# Altium integrated library Altium Library_EE4951.IntLib: 287 symbols (part 1 of 2)
Pins are listed as number, name and electrical type; pins without a type are passive.

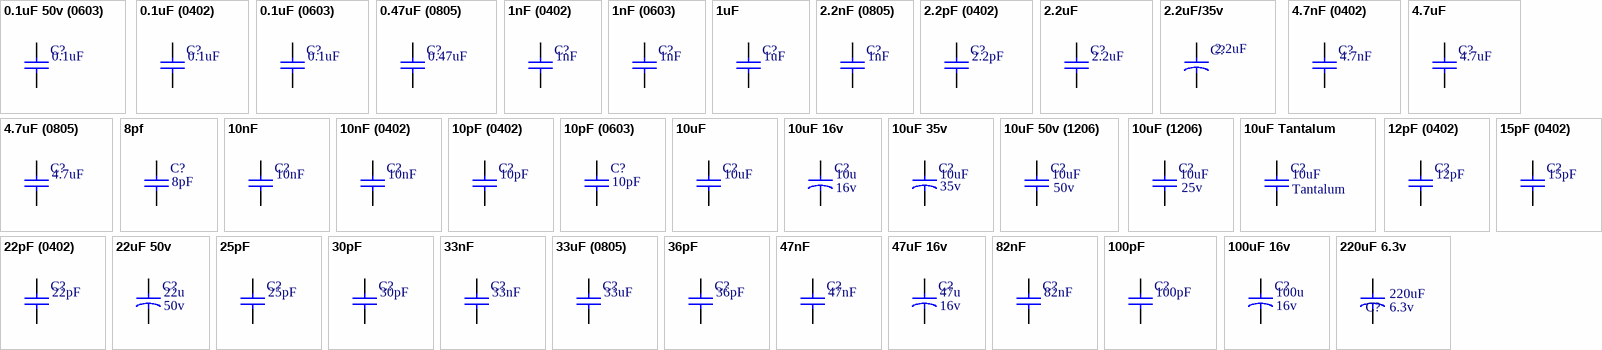
[diagram p0: symbols 0.1uF 50v (0603) to 220uF 6.3v]

## 0.1uF 50v (0603)
designator C?, comment 0.1uF
MFG_PN: VJ0603V104ZXAPW1BC; MFG: Vishay; Voltage: 50v; LOAD: NL; Value: 0.1uF
footprint CAP0603W (capacitor 0603 wave soldering)
footprint CAP0603R (capacitor 0603 reflow soldering)
pins: 1, 2

## 0.1uF (0402)
designator C?, comment 0.1uF
Tolerance: 20%; MFG_PN: VJ0402G104MXQCW1BC; MFG: Vishay; Voltage: 10v; LOAD: NL; Value: 0.1uF
footprint CAP0402R (Capacitor 0402 reflow soldering)
pins: 1, 2

## 0.1uF (0603)
designator C?, comment 0.1uF
MFG_PN: VJ0603Y104JXJPW1BC; MFG: Vishay; LOAD: NL; Value: 0.1uF
footprint CAP0603W (capacitor 0603 wave soldering)
footprint CAP0603R (capacitor 0603 reflow soldering)
pins: 1, 2

## 0.47uF (0805)
designator C?, comment 0.47uF
MFG_PN: VJ0805V474MXXCW1BC; MFG: Vishay; Voltage: 25v; LOAD: NL; Value: 0.47uF
footprint CAP0805R (capacitor 0805 reflow soldering)
footprint CAP0805W (capacitor 0805 wave soldering)
pins: 1, 2

## 1nF (0402)
designator C?, comment 1nF
Tolerance: 10%; MFG_PN: VJ0402Y102KXAAC; MFG: Vishay; Voltage: 50v; LOAD: NL; Value: 1nF
footprint CAP0402R (Capacitor 0402 reflow soldering)
pins: 1, 2

## 1nF (0603)
designator C?, comment 1nF
MFG_PN: VJ0603Y102KXBAC31; MFG: Vishay; LOAD: NL; Value: 1nF
footprint CAP0603W (capacitor 0603 wave soldering)
footprint CAP0603R (capacitor 0603 reflow soldering)
pins: 1, 2

## 1uF
designator C?
MFG_PN: VJ0805V105ZXXTW1BC; MFG: Vishay; Voltage: 25v; LOAD: NL; Value: 1uF
footprint CAP0603W (capacitor 0603 wave soldering)
footprint CAP0603R (capacitor 0603 reflow soldering)
pins: 1, 2

## 2.2nF (0805)
designator C?, comment 1nF
Tolerance: 10%; MFG_PN: VJ0805A222KXXPW1BC; MFG: Vishay; Voltage: 25v; LOAD: NL; Value: 1nF
footprint CAP0805R (capacitor 0805 reflow soldering)
footprint CAP0805W (capacitor 0805 wave soldering)
pins: 1, 2

## 2.2pF (0402)
designator C?, comment 2.2pF
Tolerance: 10%; MFG_PN: VJ0402A2R2DXXCW1BC; MFG: Vishay; Voltage: 25v; LOAD: NL; Value: 2.2pF
footprint CAP0402R (Capacitor 0402 reflow soldering)
pins: 1, 2

## 2.2uF
designator C?
MFG1_PN: VJ1206V225ZXXRW1BC; MFG1: Vishay; Value: 2.2uF
footprint CAP1206W (capacitor 1206 wave soldering)
pins: 1, 2

## 2.2uF/35v
designator C?, comment 2.2uF
Tolerance: 20%; MFG1_PN: EEE-FC1V2R2AR; MFG1: PANASONIC; Voltage: 35v; Value: 2.2uF
footprint SMD Elec Cap (5.5_5.4_4) (L=5.5mm, H=5.4mm, D=4mm)
pins: 1, 2

## 4.7nF (0402)
designator C?, comment 4.7nF
Tolerance: 10%; MFG_PN: VJ0402Y472KXACW1BC; MFG: Vishay; Voltage: 50v; LOAD: NL; Value: 4.7nF
footprint CAP0402R (Capacitor 0402 reflow soldering)
pins: 1, 2

## 4.7uF
designator C?
MFG1_PN: VJ1206V475ZXJTW1BC; MFG1: Vishay; Voltage: 16v; Value: 4.7uF
footprint CAP1206W (capacitor 1206 wave soldering)
pins: 1, 2

## 4.7uF (0805)
designator C?, comment 4.7uF
MFG_PN: VJ0805V475MXQTW1BC; MFG: Vishay; Voltage: 10v; LOAD: NL; Value: 4.7uF
footprint CAP0805R (capacitor 0805 reflow soldering)
footprint CAP0805W (capacitor 0805 wave soldering)
pins: 1, 2

## 8pf
designator C?, comment 8pF
MFG1_PN: 06031A8R0CAT2A; MFG1: AVX; Value: 8pF
footprint CAP0603W (capacitor 0603 wave soldering)
pins: 1, 2

## 10nF
designator C?
MFG1_PN: VJ0603Y103KXAAC; MFG1: Vishay; Value: 10nF
footprint CAP0603W (capacitor 0603 wave soldering)
footprint CAP0805R (capacitor 0805 reflow soldering)
pins: 1, 2

## 10nF (0402)
designator C?, comment 10nF
Tolerance: 5%; MFG_PN: VJ0402Y103JXXAC; MFG: Vishay; Voltage: 25v; LOAD: NL; Value: 10nF
footprint CAP0402R (Capacitor 0402 reflow soldering)
pins: 1, 2

## 10pF (0402)
designator C?, comment 10pF
Tolerance: 5%; MFG_PN: VJ0402A100JXACW1BC; MFG: Vishay; Voltage: 50v; LOAD: NL; Value: 10pF
footprint CAP0402R (Capacitor 0402 reflow soldering)
pins: 1, 2

## 10pF (0603)
designator C?, comment 10pF
Tolerance: 1%; MFG_PN: VJ0603A100FXACW1BC; MFG: VISHAY; Voltage: 50v; LOAD: NL; Value: 10pF
footprint CAP0603W (capacitor 0603 wave soldering)
footprint CAP0603R (capacitor 0603 reflow soldering)
pins: 1, 2

## 10uF
designator C?
MFG1_PN: VJ1206V106ZXQTW1BC; MFG1: Vishay; Value: 10uF
footprint CAP1206R (capacitor 1206 reflow soldering)
pins: 1, 2

## 10uF 16v
designator C?, comment Voltage: 16v  (hidden comment: 10u)
Tolerance: 20%; MFG_PN: EEE-FK1C100R; MFG: Panasonic; LOAD: NL; Value: 10u
footprint SMD Elec Cap (5.8_5.8_4) (L=5.8mm, H=5.8mm, D=4mm)
pins: 1, 2

## 10uF 35v
designator C?, comment Voltage: 35v  (hidden comment: 10uF)
MFG1_PN: EEE-HB1V100R; MFG1: Panasonic; Value: 10uF
footprint SMD Elec Cap (5.5_6.5_5) (L=5.5mm, H=6.5mm, D=5mm)
pins: 1, 2

## 10uF 50v (1206)
designator C?, comment Voltage: 50v  (hidden comment: 10uF)
Tolerance: 10%; MFG_PN: C3216X5R1H106K160AB; MFG: TDK; LOAD: NL; Value: 10uF
footprint CAP1206R (capacitor 1206 reflow soldering)
footprint CAP1206W (capacitor 1206 wave soldering)
pins: 1, 2

## 10uF (1206)
designator C?, comment Voltage: 25v  (hidden comment: 10uF)
Tolerance: 10%; MFG_PN: GRJ31CR71E106KE11L; MFG: MURATA; LOAD: NL; Value: 10uF
footprint CAP1206R (capacitor 1206 reflow soldering)
footprint CAP1206W (capacitor 1206 wave soldering)
pins: 1, 2

## 10uF Tantalum
designator C?, comment Type: Tantalum  (hidden comment: 10uF)
MFG1_PN: 293D106X96R3A2TE3; MFG1: Vishay; Value: 10uF
footprint CAP1206W (capacitor 1206 wave soldering)
pins: 1, 2

## 12pF (0402)
designator C?, comment 12pF
Tolerance: 5%; MFG_PN: GRM1555C1H120JA01D; MFG: Murata; Voltage: 50v; LOAD: NL; Value: 12pF
footprint CAP0402R (Capacitor 0402 reflow soldering)
pins: 1, 2

## 15pF (0402)
designator C?, comment 15pF
Tolerance: 5%; MFG_PN: VJ0402A150JXACW1BC; MFG: Vishay; Voltage: 50v; LOAD: NL; Value: 15pF
footprint CAP0402R (Capacitor 0402 reflow soldering)
pins: 1, 2

## 22pF (0402)
designator C?, comment 22pF
Tolerance: 5%; MFG_PN: 04025A220JAT2A; MFG: AVX; Voltage: 50v; LOAD: NL; Value: 22pF
footprint CAP0402R (Capacitor 0402 reflow soldering)
pins: 1, 2

## 22uF 50v
designator C?, comment Voltage: 50v  (hidden comment: 22u)
MFG1_PN: EEE-FK1H220P; MFG1: Panasonic; Value: 22u
footprint SMD Elec Cap (5.8_5.8_6.3) (L=5.8mm, H=5.8mm, D=6.3mm)
pins: 1, 2

## 25pF
designator C?
Tolerance: 2%; MFG_PN: 06035A250GAT2A; MFG: AVX; Voltage: 50v; LOAD: NL; Value: 25pF
footprint CAP0603W (capacitor 0603 wave soldering)
footprint CAP0603R (capacitor 0603 reflow soldering)
pins: 1, 2

## 30pF
designator C?
MFG1_PN: VJ0805A300JXBAT; MFG1: Vishay; Value: 30pF
footprint CAP0603W (capacitor 0603 wave soldering)
pins: 1, 2

## 33nF
designator C?
Tolerance: 5%; MFG1_PN: VJ0603Y333KXACW1BC; MFG1: Vishay; Voltage: 50v; Value: 33nF
footprint CAP0603W (capacitor 0603 wave soldering)
pins: 1, 2

## 33uF (0805)
designator C?, comment 33uF
MFG_PN: C2012X5R1A336M125AC; MFG: TDK; Voltage: 10v; LOAD: NL; Value: 33uF
footprint CAP0805R (capacitor 0805 reflow soldering)
footprint CAP0805W (capacitor 0805 wave soldering)
pins: 1, 2

## 36pF
designator C?
Tolerance: 2%; MFG_PN: GRM0335C1H360GA01D; MFG: MURATA; Voltage: 50v; LOAD: NL; Value: 36pF
footprint CAP0603W (capacitor 0603 wave soldering)
footprint CAP0603R (capacitor 0603 reflow soldering)
pins: 1, 2

## 47nF
designator C?
MFG_PN: VJ0603Y473JXQPW1BC; MFG: Vishay; Voltage: 10v; LOAD: NL; Value: 47nF
footprint CAP0603W (capacitor 0603 wave soldering)
footprint CAP0603R (capacitor 0603 reflow soldering)
pins: 1, 2

## 47uF 16v
designator C?, comment Voltage: 16v  (hidden comment: 47u)
MFG1_PN: EEE-FK1C470P; MFG1: Panasonic; Value: 47u
footprint SMD Elec Cap (5.8_5.8_6.3) (L=5.8mm, H=5.8mm, D=6.3mm)
pins: 1, 2

## 82nF
designator C?
Tolerance: 5%; MFG1_PN: VJ0805Y823JXXPW1BC; MFG1: Vishay; Voltage: 25v; Value: 82nF
footprint CAP0603W (capacitor 0603 wave soldering)
pins: 1, 2

## 100pF
designator C?
MFG1_PN: VJ0603A101JNAAO; MFG1: Vishay; Voltage: 50v; Value: 100pF
footprint CAP0603W (capacitor 0603 wave soldering)
pins: 1, 2

## 100uF 16v
designator C?, comment Voltage: 16v  (hidden comment: 100u)
MFG1_PN: EEE-1CA101WP; MFG1: Panasonic; Value: 100u
footprint SMD Elec Cap (5.5_5.4_6.3) (L=5.5mm, H=5.4mm, D=6.3mm)
pins: 1, 2

## 220uF 6.3v
designator C?, comment value 220uF  Voltage: 6.3v  (hidden comment: EEE-0JA221WP)
MFG: Panasonic; MFG_PN: EEE-0JA221WP
footprint SMD Elec Cap (5.5_5.4_6.3) (L=5.5mm, H=5.4mm, D=6.3mm)
pins: 1, 2

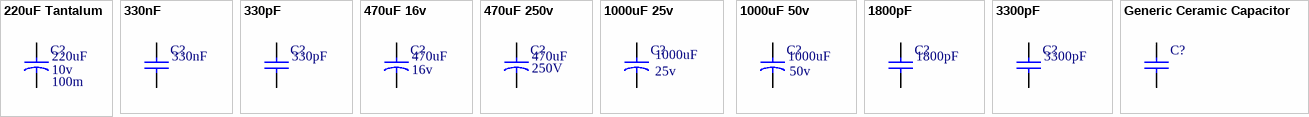
[diagram p1: symbols 220uF Tantalum to Generic Ceramic Capacitor]

## 220uF Tantalum
designator C?, comment Voltage: 10v  ESR: 100m  (hidden comment: 220uF)
Tolerance: 20%; MFG_PN: TR3D227M010C0100; MFG: VISHAY; LOAD: NL; Value: 220uF
footprint D-CASE Tantalum
pins: 1, 2

## 330nF
designator C?
MFG1_PN: VJ0805V334ZXAPW1BC; MFG1: Vishay; Voltage: 50v; Value: 330nF
footprint CAP0805W (capacitor 0805 wave soldering)
pins: 1, 2

## 330pF
designator C?
Tolerance: 5%; MFG1_PN: VJ0805A331JXACW1BC; MFG1: Vishay; Voltage: 50v; Value: 330pF
footprint CAP0805W (capacitor 0805 wave soldering)
pins: 1, 2

## 470uF 16v
designator C?, comment Voltage: 16v  (hidden comment: 470uF)
Tolerance: 20%; MFG_PN: EEE-FP1C471AP; MFG: Panasonic; LOAD: NL; Value: 470uF
footprint SMD Elec Cap (10.5_10.2_8) (L=10.5mm, H=10.2mm, D=8mm)
pins: 1, 2

## 470uF 250v
designator C?, comment Voltage: 250V  (hidden comment: 470uF)
MFG1_PN: LLS2E471MELB; MFG1: Nichicon; Value: 470uF
footprint Elec. Cap. TH (THrough-hole (D=30mm, L=25mm, LS=10mm))
pins: 1, 2

## 1000uF 25v
designator C?, comment Voltage: 25v  (hidden comment: 1000uF)
Tolerance: 20%; MFG1_PN: EEV-FK1E102Q; MFG1: PANASONIC; Value: 1000uF
footprint SMD Elec Cap (13.5_15_12.5) (L=13.5mm, H=15mm, D=12.5mm)
pins: 1, 2

## 1000uF 50v
designator C?, comment Voltage: 50v  (hidden comment: 1000uF)
MFG1_PN: EEV-FK1H102M; MFG1: Panasonic; Value: 1000uF
footprint SMD Elec Cap (17_16.5_16) (L=17mm, H=16.5mm, D=16mm)
pins: 1, 2

## 1800pF
designator C?
Tolerance: 5%; MFG1_PN: VJ0603Y182JXAAC; MFG1: Vishay; Voltage: 50v; Value: 1800pF
footprint CAP0603W (capacitor 0603 wave soldering)
pins: 1, 2

## 3300pF
designator C?
Tolerance: 20%; MFG1_PN: VJ0603Y332MXAPW1BC; MFG1: Vishay; Voltage: 50; Value: 3300pF
footprint CAP0603W (capacitor 0603 wave soldering)
pins: 1, 2

## Generic Ceramic Capacitor
designator C?
MFG1: Vishay; LOAD: NL
pins: 1, 2


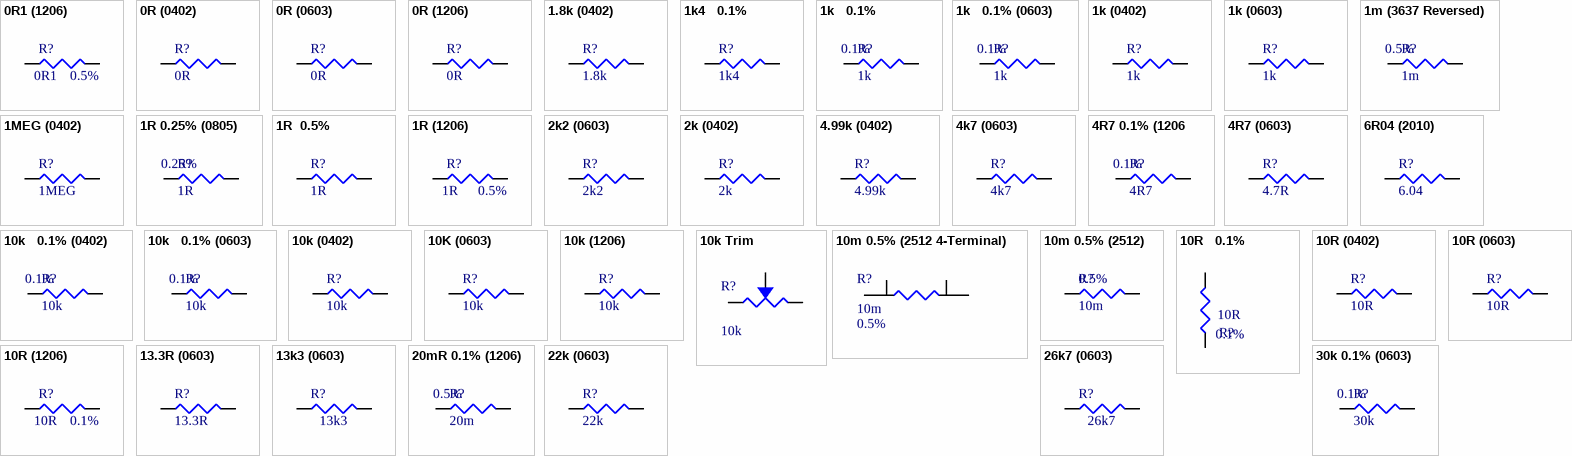
[diagram p2: symbols 0R1 (1206) to 30k 0.1% (0603)]

## 0R1 (1206)
designator R?, comment Tolerance: 0.5%  (hidden comment: 0R1)
100mR Current Sense Resistor; POWER: 0.25w; MFG_PN: WSL1206R1000DEA; MFG: Vishay; Load: NL; Value: 0R1
footprint RES1206W (resistor 1206 wave soldering)
pins: 1, 2
1 alternate drawing of the same symbol

## 0R (0402)
designator R?, comment 0R
MFG_PN: CRCW04020000Z0ED; MFG: Vishay; Load: NL; Value: 0R
footprint RES0402R (resistor 0402 reflow soldering)
pins: 1, 2
1 alternate drawing of the same symbol

## 0R (0603)
designator R?, comment 0R
MFG_PN: CRCW12060000Z0EA; MFG: Vishay; Load: NL; Value: 0R
footprint RES0603W (resistor 0603 wave soldering)
pins: 1, 2
1 alternate drawing of the same symbol

## 0R (1206)
designator R?, comment 0R
0R, 1206; MFG_PN: CRCW12060000Z0EA; MFG: Vishay; Load: NL; Value: 0R
footprint RES1206W (resistor 1206 wave soldering)
pins: 1, 2
1 alternate drawing of the same symbol

## 1.8k (0402)
designator R?, comment 1.8k
Tolerance: 1%; POWER: 63mW; MFG_PN: CRCW04021K80FKED; MFG: Vishay; Load: NL; Value: 1.8k
footprint RES0402R (resistor 0402 reflow soldering)
pins: 1, 2
1 alternate drawing of the same symbol

## 1k4   0.1%
designator R?, comment 1k4
Tolerance: 0.1%; POWER: 0.1W; MFG1_PN: TNPW06031K40BEEA; MFG1: Vishay; Load: NL; Value: 1k4
footprint RES0603W (resistor 0603 wave soldering)
pins: 1, 2
1 alternate drawing of the same symbol

## 1k   0.1%
designator R?, comment Tolerance: 0.1%  (hidden comment: 1k)
POWER: 0.125W; MFG1_PN: TNPW08051K00BEEA; MFG1: Vishay; Load: NL; Value: 1k
footprint RES0603W (resistor 0603 wave soldering)
pins: 1, 2
1 alternate drawing of the same symbol

## 1k   0.1% (0603)
designator R?, comment Tolerance: 0.1%  (hidden comment: 1k)
POWER: 0.1W; MFG_PN: TNPW06031K00BEEA; MFG: Vishay; Load: NL; TEMP_COEF: 25ppm; Value: 1k
footprint RES0603W (resistor 0603 wave soldering)
pins: 1, 2
1 alternate drawing of the same symbol

## 1k (0402)
designator R?, comment 1k
Tolerance: 1%; POWER: 63mW; MFG_PN: CRCW04021K00FKED; MFG: Vishay; Load: NL; Value: 1k
footprint RES0402R (resistor 0402 reflow soldering)
pins: 1, 2
1 alternate drawing of the same symbol

## 1k (0603)
designator R?, comment 1k
Tolerance: 1%; POWER: 0.1W; MFG_PN: CRCW06031K00FKEA; MFG: Vishay; Load: NL; Value: 1k
footprint RES0603W (resistor 0603 wave soldering)
pins: 1, 2
1 alternate drawing of the same symbol

## 1m (3637 Reversed)
designator R?, comment Tolerance: 0.5%  (hidden comment: 1m)
POWER: 3W; MFG_PN: WSL36371L000DEA; MFG: Vishay; Load: NL; Value: 1m
footprint 3637 Reversed
pins: 1, 2, 3, 4
1 alternate drawing of the same symbol

## 1MEG (0402)
designator R?, comment 1MEG
Tolerance: 1%; POWER: 63mW; MFG_PN: CRCW04021M00FKED; MFG: Vishay; Load: NL; Value: 1MEG
footprint RES0402R (resistor 0402 reflow soldering)
pins: 1, 2
1 alternate drawing of the same symbol

## 1R 0.25% (0805)
designator R?, comment Tolerance: 0.25%  (hidden comment: 1R)
POWER: 100mW; MFG_PN: CRT0805-CY-1R00ELF; MFG: Bourns; Load: NL; Value: 1R
footprint RES0805R (resistor 0805 reflow soldering)
footprint RES0805W (resistor 0805 wave soldering)
pins: 1, 2
1 alternate drawing of the same symbol

## 1R  0.5%
designator R?, comment 1R
Tolerance: 0.5%; POWER: 0.33W; MFG1_PN: SR732BTTD1R00D; MFG1: KOA Speer; Load: NL; Value: 1R
footprint RES1206W (resistor 1206 wave soldering)
pins: 1, 2
1 alternate drawing of the same symbol

## 1R (1206)
designator R?, comment Tolerance: 0.5%  (hidden comment: 1R)
1R Current Sense Resistor; POWER: 0.33w; MFG_PN: SR732BTTD1R00D; MFG: KOA; Load: NL; Value: 1R
footprint RES1206W (resistor 1206 wave soldering)
pins: 1, 2
1 alternate drawing of the same symbol

## 2k2 (0603)
designator R?, comment 2k2
Tolerance: 1%; POWER: 0.1W; MFG_PN: CRCW06032K20FKEA; MFG: Vishay; Load: NL; Value: 2k2
footprint RES0603W (resistor 0603 wave soldering)
pins: 1, 2
1 alternate drawing of the same symbol

## 2k (0402)
designator R?, comment 2k
Tolerance: 1%; POWER: 63mW; MFG_PN: CRCW04022K00FKED; MFG: Vishay; Load: NL; Value: 2k
footprint RES0402R (resistor 0402 reflow soldering)
pins: 1, 2
1 alternate drawing of the same symbol

## 4.99k (0402)
designator R?, comment 4.99k
Tolerance: 1%; POWER: 63mW; MFG_PN: CRCW04024K99FKED; MFG: Vishay; Load: NL; Value: 4.99k
footprint RES0402R (resistor 0402 reflow soldering)
pins: 1, 2
1 alternate drawing of the same symbol

## 4k7 (0603)
designator R?, comment 4k7
Tolerance: 1%; POWER: 0.1W; MFG_PN: CRCW06034K70FKEA; MFG: Vishay; Load: NL; Value: 4k7
footprint RES0603W (resistor 0603 wave soldering)
pins: 1, 2
1 alternate drawing of the same symbol

## 4R7 0.1% (1206
designator R?, comment Tolerance: 0.1%  (hidden comment: 4R7)
POWER: 0.1W; MFG_PN: CRT1206-BY-4R70ELF; MFG: Bourns; Load: NL; Value: 4R7
footprint RES1206W (resistor 1206 wave soldering)
pins: 1, 2
1 alternate drawing of the same symbol

## 4R7 (0603)
designator R?, comment 4.7R
Tolerance: 1%; POWER: 0.1W; MFG_PN: CRCW06034R70FKEA; MFG: Vishay; Load: NL; Value: 4.7R
footprint RES0603W (resistor 0603 wave soldering)
pins: 1, 2
1 alternate drawing of the same symbol

## 6R04 (2010)
designator R?, comment 6.04
Tolerance: 1%; POWER: 0.750mW; MFG_PN: SR732HTTE6R04F; MFG: KOA Speer; Load: NL; Value: 6.04
footprint RES2010W (resistor 2010 wave soldering)
pins: 1, 2
1 alternate drawing of the same symbol

## 10k   0.1% (0402)
designator R?, comment Tolerance: 0.1%  (hidden comment: 10k)
POWER: 63mW; MFG_PN: TNPW040210K0BEED; MFG: Vishay; Load: NL; Value: 10k
footprint RES0402R (resistor 0402 reflow soldering)
pins: 1, 2
1 alternate drawing of the same symbol

## 10k   0.1% (0603)
designator R?, comment Tolerance: 0.1%  (hidden comment: 10k)
POWER: 0.1W; MFG_PN: TNPW060310K0BEEA; MFG: Vishay; Load: NL; Value: 10k
footprint RES0603W (resistor 0603 wave soldering)
pins: 1, 2
1 alternate drawing of the same symbol

## 10k (0402)
designator R?, comment 10k
Tolerance: 1%; POWER: 63mW; MFG_PN: CRCW040210K0FKED; MFG: Vishay; Load: NL; Value: 10k
footprint RES0402R (resistor 0402 reflow soldering)
pins: 1, 2
1 alternate drawing of the same symbol

## 10K (0603)
designator R?, comment 10k
Tolerance: 1%; POWER: 0.1W; MFG_PN: CRCW060310K0FKEA; MFG: Vishay; Load: NL; Value: 10k
footprint RES0603W (resistor 0603 wave soldering)
footprint RES0603R (resistor 0603 reflow soldering)
pins: 1, 2
1 alternate drawing of the same symbol

## 10k (1206)
designator R?, comment 10k
Tolerance: 1%; POWER: 0.25W; MFG_PN: CRCW120610K0FKEA; MFG: Vishay; Load: NL; Value: 10k
footprint RES1206W (resistor 1206 wave soldering)
pins: 1, 2
1 alternate drawing of the same symbol

## 10k Trim
designator R?, comment value 10k  (hidden comment: Bourns)
MFG_PN: 3223W-1-103; LOAD: NL; MFG: Bourns
footprint Trimmer Resistor 3223W (SMD Trimmer Resistor)
pins: 1, 2, 3

## 10m 0.5% (2512 4-Terminal)
designator R?, comment 10m  TOLERANCE: 0.5%
10mR Current Sense - 4-Terminal; MFG_PN: WSK2512R0100DEA; MFG: VISHAY; POWER: 1W; LOAD: NL; VALUE: 10m
footprint 2512 4 Terminal
pins: 1, 2, 3, 4

## 10m 0.5% (2512)
designator R?, comment Tolerance: 0.5%  (hidden comment: 10m)
POWER: 1W; MFG_PN: WSL2512R0100DEA; MFG: VISHAY; Load: NL; Value: 10m
footprint RES2512R (resistor 2512 reflow soldering)
footprint RES2512W (resistor 2512 wave soldering)
pins: 1, 2
1 alternate drawing of the same symbol

## 10R   0.1%
designator R?, comment Tolerance: 0.1%  (hidden comment: 10R)
POWER: 0.1W; MFG1_PN: TNPW060310R0BEEA; MFG1: Vishay; Load: NL; Value: 10R
footprint RES0603W (resistor 0603 wave soldering)
pins: 1, 2
1 alternate drawing of the same symbol

## 10R (0402)
designator R?, comment 10R
Tolerance: 1%; POWER: 63mW; MFG_PN: CRCW040210R0FKED; MFG: Vishay; Load: NL; Value: 10R
footprint RES0402R (resistor 0402 reflow soldering)
pins: 1, 2
1 alternate drawing of the same symbol

## 10R (0603)
designator R?, comment 10R
Tolerance: 1%; POWER: 0.1W; MFG_PN: CRCW060310R0FKEA; MFG: Vishay; Load: NL; Value: 10R
footprint RES0603W (resistor 0603 wave soldering)
pins: 1, 2
1 alternate drawing of the same symbol

## 10R (1206)
designator R?, comment Tolerance: 0.1%  (hidden comment: 10R)
10R Current Sense Resistor; POWER: 0.33w; MFG_PN: TNPW120610R0BEEA; MFG: VISHAY; Load: NL; TEMP_COEFF: 25ppm; Value: 10R
footprint RES1206W (resistor 1206 wave soldering)
pins: 1, 2
1 alternate drawing of the same symbol

## 13.3R (0603)
designator R?, comment 13.3R
Tolerance: 1%; POWER: 0.1W; MFG_PN: CRCW060313R3FKEA; MFG: Vishay; Load: NL; Value: 13.3R
footprint RES0603W (resistor 0603 wave soldering)
pins: 1, 2
1 alternate drawing of the same symbol

## 13k3 (0603)
designator R?, comment 13k3
Tolerance: 1%; POWER: 0.1W; MFG_PN: CRCW060313K3FKEA; MFG: Vishay; Load: NL; Value: 13k3
footprint RES0603W (resistor 0603 wave soldering)
pins: 1, 2
1 alternate drawing of the same symbol

## 20mR 0.1% (1206)
designator R?, comment Tolerance: 0.5%  (hidden comment: 20m)
POWER: 0.25W; MFG_PN: WSL1206R0200DBA; MFG: Vishay; Load: NL; Value: 20m
footprint RES1206W (resistor 1206 wave soldering)
pins: 1, 2
1 alternate drawing of the same symbol

## 22k (0603)
designator R?, comment 22k
Tolerance: 1%; POWER: 0.1W; MFG_PN: CRCW060322K0FKEA; MFG: Vishay; Load: NL; Value: 22k
footprint RES0603W (resistor 0603 wave soldering)
pins: 1, 2
1 alternate drawing of the same symbol

## 26k7 (0603)
designator R?, comment 26k7
Tolerance: 1%; POWER: 0.1W; MFG_PN: CRCW060326K7FKEA; MFG: Vishay; Load: NL; Value: 26k7
footprint RES0603W (resistor 0603 wave soldering)
pins: 1, 2
1 alternate drawing of the same symbol

## 30k 0.1% (0603)
designator R?, comment Tolerance: 0.1%  (hidden comment: 30k)
POWER: 0.1W; MFG1_PN: TNPW060330K0BEEA; MFG1: Vishay; Load: NL; Value: 30k
footprint RES0603W (resistor 0603 wave soldering)
footprint RES0603R (resistor 0603 reflow soldering)
pins: 1, 2
1 alternate drawing of the same symbol

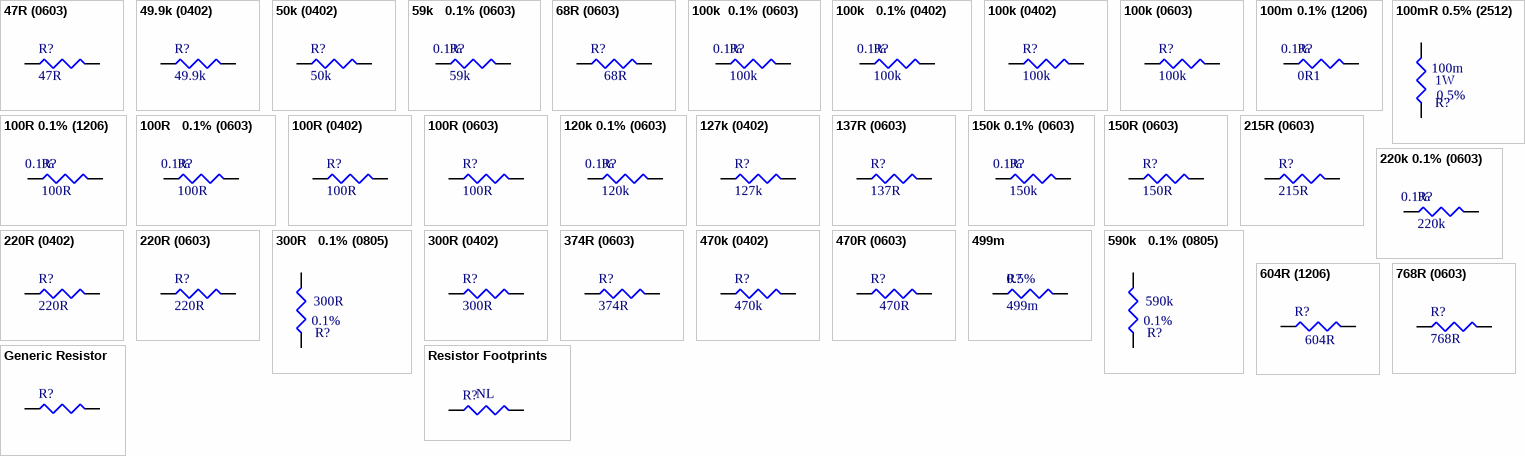
[diagram p3: symbols 47R (0603) to Resistor Footprints]

## 47R (0603)
designator R?, comment 47R
Tolerance: 1%; POWER: 0.1W; MFG_PN: CRCW060347R0FKEA; MFG: Vishay; Load: NL; Value: 47R
footprint RES0603W (resistor 0603 wave soldering)
pins: 1, 2
1 alternate drawing of the same symbol

## 49.9k (0402)
designator R?, comment 49.9k
Tolerance: 1%; POWER: 63mW; MFG_PN: CRCW040249K9FKED; MFG: Vishay; Load: NL; Value: 49.9k
footprint RES0402R (resistor 0402 reflow soldering)
pins: 1, 2
1 alternate drawing of the same symbol

## 50k (0402)
designator R?, comment 50k
Tolerance: 1%; POWER: 63mW; MFG_PN: CRCW040250K0FKED; MFG: Vishay; Load: NL; Value: 50k
footprint RES0402R (resistor 0402 reflow soldering)
pins: 1, 2
1 alternate drawing of the same symbol

## 59k   0.1% (0603)
designator R?, comment Tolerance: 0.1%  (hidden comment: 59k)
POWER: 0.1W; MFG_PN: TNPW060359K0BEEA; MFG: Vishay; Load: NL; Value: 59k
footprint RES0603W (resistor 0603 wave soldering)
pins: 1, 2
1 alternate drawing of the same symbol

## 68R (0603)
designator R?, comment 68R
Tolerance: 1%; POWER: 0.1W; MFG_PN: CRCW060368R0FKEB; MFG: Vishay; Load: NL; Value: 68R
footprint RES0603W (resistor 0603 wave soldering)
pins: 1, 2
1 alternate drawing of the same symbol

## 100k  0.1% (0603)
designator R?, comment Tolerance: 0.1%  (hidden comment: 100k)
POWER: 0.1W; MFG_PN: TNPW0603100KBEEA; MFG: Vishay; Load: NL; Value: 100k
footprint RES0603W (resistor 0603 wave soldering)
pins: 1, 2
1 alternate drawing of the same symbol

## 100k   0.1% (0402)
designator R?, comment Tolerance: 0.1%  (hidden comment: 100k)
POWER: 63mW; MFG_PN: TNPW0402100KBEED; MFG: Vishay; Load: NL; Value: 100k
footprint RES0402R (resistor 0402 reflow soldering)
pins: 1, 2
1 alternate drawing of the same symbol

## 100k (0402)
designator R?, comment 100k
Tolerance: 1%; POWER: 63mW; MFG_PN: CRCW0402100KFKED; MFG: Vishay; Load: NL; Value: 100k
footprint RES0402R (resistor 0402 reflow soldering)
pins: 1, 2
1 alternate drawing of the same symbol

## 100k (0603)
designator R?, comment 100k
Tolerance: 1%; POWER: 0.1W; MFG1_PN: CRCW0603100KFKEA; MFG1: Vishay; Load: NL; Value: 100k
footprint RES0603W (resistor 0603 wave soldering)
pins: 1, 2
1 alternate drawing of the same symbol

## 100m 0.1% (1206)
designator R?, comment Tolerance: 0.1%  (hidden comment: 0R1)
POWER: 1W; MFG_PN: WSL1206R1000DEA; MFG: Vishay; Load: NL; Value: 0R1
footprint RES1206W (resistor 1206 wave soldering)
footprint RES1206R (resistor 1206 reflow soldering)
pins: 1, 2
1 alternate drawing of the same symbol

## 100mR 0.5% (2512)
designator R?, comment POWER: 1W  Tolerance: 0.5%  (hidden comment: 100m)
MFG_PN: WSL2512R1000DEA; MFG: Vishay; Load: NL; Value: 100m
footprint RES2512W (resistor 2512 wave soldering)
pins: 1, 2
1 alternate drawing of the same symbol

## 100R 0.1% (1206)
designator R?, comment Tolerance: 0.1%  (hidden comment: 100R)
POWER: 1W; MFG_PN: PHP01206E1000BST5; MFG: Vishay; Load: NL; Value: 100R
footprint RES1206W (resistor 1206 wave soldering)
pins: 1, 2
1 alternate drawing of the same symbol

## 100R   0.1% (0603)
designator R?, comment Tolerance: 0.1%  (hidden comment: 100R)
POWER: 0.1W; MFG_PN: TNPW0603100RBEEA; MFG: Vishay; Load: NL; TEMP_COEF: 20ppm; Value: 100R
footprint RES0603W (resistor 0603 wave soldering)
pins: 1, 2
1 alternate drawing of the same symbol

## 100R (0402)
designator R?, comment 100R
Tolerance: 1%; POWER: 63mW; MFG_PN: CRCW0402100RFKED; MFG: Vishay; Load: NL; Value: 100R
footprint RES0402R (resistor 0402 reflow soldering)
pins: 1, 2
1 alternate drawing of the same symbol

## 100R (0603)
designator R?, comment 100R
Tolerance: 1%; POWER: 0.1W; MFG_PN: CRCW0603100RFKEA; MFG: Vishay; Load: NL; Value: 100R
footprint RES0603W (resistor 0603 wave soldering)
pins: 1, 2
1 alternate drawing of the same symbol

## 120k 0.1% (0603)
designator R?, comment Tolerance: 0.1%  (hidden comment: 120k)
POWER: 100mW; MFG_PN: TNPW0603120KBEEA; MFG: Vishay; Load: NL; Value: 120k
footprint RES0603W (resistor 0603 wave soldering)
footprint RES0603R (resistor 0603 reflow soldering)
pins: 1, 2
1 alternate drawing of the same symbol

## 127k (0402)
designator R?, comment 127k
Tolerance: 1%; POWER: 63mW; MFG_PN: CRCW0402127KFKED; MFG: Vishay; Load: NL; Value: 127k
footprint RES0402R (resistor 0402 reflow soldering)
pins: 1, 2
1 alternate drawing of the same symbol

## 137R (0603)
designator R?, comment 137R
Tolerance: 1%; POWER: 0.1W; MFG_PN: CRCW0603137RFKEA; MFG: Vishay; Load: NL; Value: 137R
footprint RES0603W (resistor 0603 wave soldering)
pins: 1, 2
1 alternate drawing of the same symbol

## 150k 0.1% (0603)
designator R?, comment Tolerance: 0.1%  (hidden comment: 150k)
POWER: 100mW; MFG_PN: TNPW0603150KBEEA; MFG: Vishay; Load: NL; Value: 150k
footprint RES0603W (resistor 0603 wave soldering)
footprint RES0603R (resistor 0603 reflow soldering)
pins: 1, 2
1 alternate drawing of the same symbol

## 150R (0603)
designator R?, comment 150R
Tolerance: 1%; POWER: 0.1W; MFG_PN: CRCW0603150RFKEA; MFG: Vishay; Load: NL; Value: 150R
footprint RES0603W (resistor 0603 wave soldering)
pins: 1, 2
1 alternate drawing of the same symbol

## 215R (0603)
designator R?, comment 215R
Tolerance: 1%; POWER: 0.1W; MFG_PN: CRCW0603215RFKEA; MFG: Vishay; Load: NL; Value: 215R
footprint RES0603W (resistor 0603 wave soldering)
pins: 1, 2
1 alternate drawing of the same symbol

## 220k 0.1% (0603)
designator R?, comment Tolerance: 0.1%  (hidden comment: 220k)
POWER: 0.1W; MFG1_PN: TNPW0603220KBEEA; MFG1: Vishay; Load: NL; Value: 220k
footprint RES0603W (resistor 0603 wave soldering)
footprint RES0603R (resistor 0603 reflow soldering)
pins: 1, 2
1 alternate drawing of the same symbol

## 220R (0402)
designator R?, comment 220R
Tolerance: 1%; POWER: 63mW; MFG_PN: CRCW0402220RFKED; MFG: Vishay; Load: NL; Value: 220R
footprint RES0402R (resistor 0402 reflow soldering)
pins: 1, 2
1 alternate drawing of the same symbol

## 220R (0603)
designator R?, comment 220R
Tolerance: 1%; POWER: 0.1W; MFG_PN: CRCW0603220RFKEB; MFG: Vishay; Load: NL; Value: 220R
footprint RES0603W (resistor 0603 wave soldering)
footprint RES0603R (resistor 0603 reflow soldering)
pins: 1, 2
1 alternate drawing of the same symbol

## 300R   0.1% (0805)
designator R?, comment Tolerance: 0.1%  (hidden comment: 300R)
POWER: 0.125W; MFG_PN: TNPW0805300RBEEA; MFG: Vishay; Load: NL; Value: 300R
footprint RES0805W (resistor 0805 wave soldering)
pins: 1, 2
1 alternate drawing of the same symbol

## 300R (0402)
designator R?, comment 300R
Tolerance: 1%; POWER: 63mW; MFG_PN: CRCW0402300RFKED; MFG: Vishay; Load: NL; Value: 300R
footprint RES0402R (resistor 0402 reflow soldering)
pins: 1, 2
1 alternate drawing of the same symbol

## 374R (0603)
designator R?, comment 374R
Tolerance: 1%; POWER: 0.1W; MFG_PN: CRCW0603374RFKEA; MFG: Vishay; Load: NL; Value: 374R
footprint RES0603W (resistor 0603 wave soldering)
pins: 1, 2
1 alternate drawing of the same symbol

## 470k (0402)
designator R?, comment 470k
Tolerance: 1%; POWER: 63mW; MFG_PN: CRCW0402470KFKED; MFG: Vishay; Load: NL; Value: 470k
footprint RES0402R (resistor 0402 reflow soldering)
pins: 1, 2
1 alternate drawing of the same symbol

## 470R (0603)
designator R?, comment 470R
Tolerance: 1%; POWER: 0.1W; MFG_PN: CRCW0603470RFKEA; MFG: Vishay; Load: NL; Value: 470R
footprint RES0603W (resistor 0603 wave soldering)
pins: 1, 2
1 alternate drawing of the same symbol

## 499m
designator R?  Tolerance: 0.5%  (hidden comment: 499m)
POWER: 330mW; MFG_PN: SR732BTTDR499D; MFG: KOA_SPEER; Load: NL; Value: 499m
footprint RES1206R (resistor 1206 reflow soldering)
pins: 1, 2
1 alternate drawing of the same symbol

## 590k   0.1% (0805)
designator R?, comment Tolerance: 0.1%  (hidden comment: 590k)
POWER: 0.125W; MFG_PN: TNPW0805590KBEEA; MFG: Vishay; Load: NL; Value: 590k
footprint RES0805W (resistor 0805 wave soldering)
footprint RES0805R (resistor 0805 reflow soldering)
pins: 1, 2
1 alternate drawing of the same symbol

## 604R (1206)
designator R?, comment 604R
POWER: 0.5W; MFG_PN: CRCW1206604RFKEAHP; MFG: VISHAY; Load: NL; Tolerance: 1%; Value: 604R
footprint RES1206W (resistor 1206 wave soldering)
pins: 1, 2
1 alternate drawing of the same symbol

## 768R (0603)
designator R?, comment 768R
Tolerance: 1%; POWER: 0.1W; MFG_PN: CRCW0603768RFKEA; MFG: Vishay; Load: NL; Value: 768R
footprint RES0603W (resistor 0603 wave soldering)
pins: 1, 2
1 alternate drawing of the same symbol

## Generic Resistor
designator R?
MFG: Vishay; Load: NL
pins: 1, 2
1 alternate drawing of the same symbol

## Resistor Footprints
designator R?, comment Load: NL  (hidden comment: VAL)
Resistor Footprints
footprint RES0402R (resistor 0402 reflow soldering)
footprint RES0805W (resistor 0805 wave soldering)
footprint RES1206W (resistor 1206 wave soldering)
footprint RES2010W (resistor 2010 wave soldering)
footprint RES2512W (resistor 2512 wave soldering)
footprint RES0603W (resistor 0603 wave soldering)
pins: 1, 2
1 alternate drawing of the same symbol


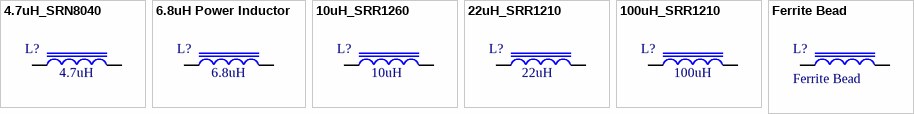
[diagram p4: symbols 4.7uH_SRN8040 to Ferrite Bead]

## 4.7uH_SRN8040
designator L?, comment 4.7uH
MFG: Bourns; MFG_PN: SRN8040-4R7Y; Value: 4.7uH
footprint Bourns_SRN8040
pins: 1, 2

## 6.8uH Power Inductor
designator L?, comment 6.8uH
6.8uH Shielded Power Inductor; MFG: SUMIDA; MFG_PN: CDRH3D28NP-6R8NC; CURRENT: 1.32A; SHIELDED: TRUE; LOAD: NL; RESISTANCE: 119m; Value: 6.8uH
footprint CDRH3D28NP-6R8NC
pins: 1, 2

## 10uH_SRR1260
designator L?, comment 10uH
MFG: Bourns; MFG_PN: SRR1260-100M; Value: 10uH
footprint SRR1260-100M
pins: 1, 2

## 22uH_SRR1210
designator L?, comment 22uH
MFG: Bourns; MFG_PN: SRR1210-220M; CURRENT: 5.2A; Value: 22uH
footprint Bourns_SRR1210 (SMD Inductor, 1210 package)
pins: 1, 2

## 100uH_SRR1210
designator L?, comment 100uH
MFG: Bourns; MFG_PN: SRR1210-220M; Value: 100uH
footprint Bourns_SRR1210 (SMD Inductor, 1210 package)
pins: 1, 2

## Ferrite Bead
designator L?
EMI Suppression/Ferrite Bead; MFG: VISHAY; MFG_PN: ILBB0603ER400V; Value: 40R; CURRENT: 400mA
footprint RES0603W (resistor 0603 wave soldering)
pins: 1, 2

